# Altium schematic symbol library CUSTOM SCH - Copy.SchLib: 494 symbols (part 3 of 6)
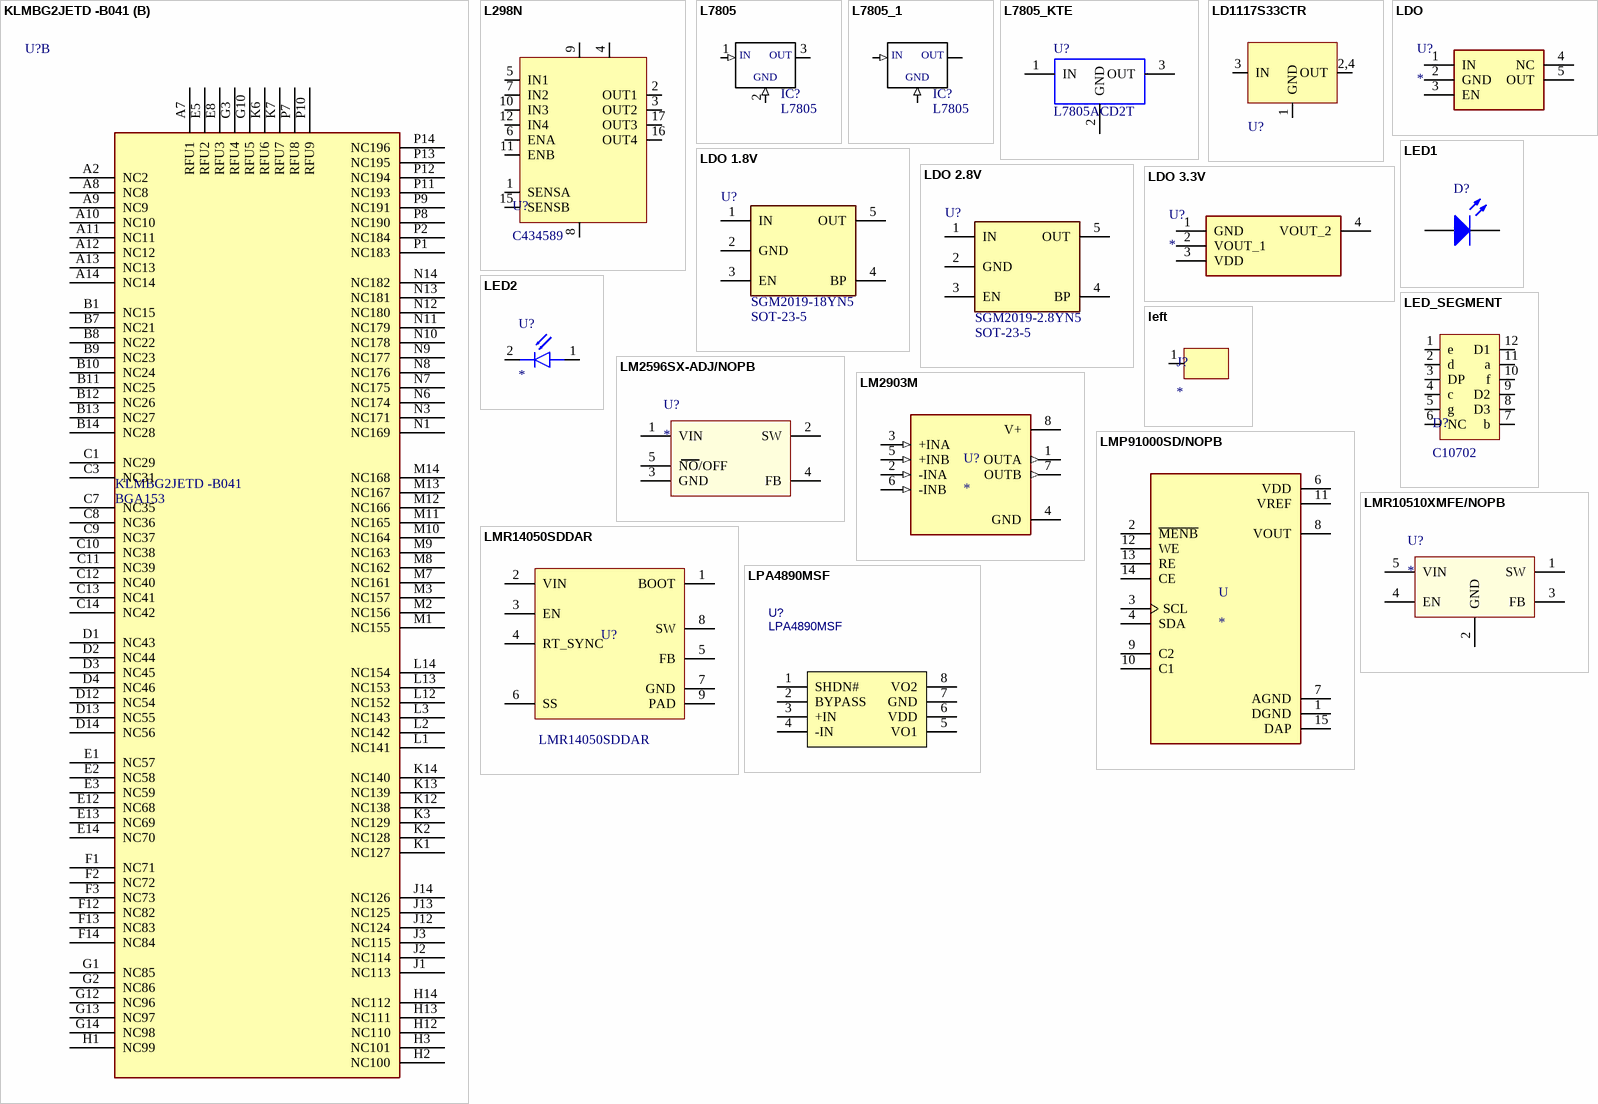
[diagram p51: symbols KLMBG2JETD -B041 to LPA4890MSF]

## LD1117S33CTR
designator U?
LDO Voltage Regulators 3.3V 0.8A Positive; Manufacturer 1: STMicroelectronics; Manufacturer Part Number 1: LD1117S33CTR; Accuracy: 1%; Input Bias Current: 5mA; Number of Regulators: 1; Quiescent Current: 10mA; Power Dissipation: 12W; Output Current: 950mA; Min Input Voltage: 5.3V; Dropout Voltage: 1.1V; Max Output Current: 1.3A; Max Input Voltage: 15V; Output Type: Fixed; Supplier 1: Digi-Key; RoHS: Yes; Category: Voltage Regulators - Linear; Stock 1: 40691; Pricing 1: 1=0.41000, 10=0.35100, 25=0.32720, 100=0.24310, 250=0.20572, 500=0.19636, 1000=0.14493 (USD); Mount: Surface Mount; Case/Package: SOT-223; Number of Pins: 4; Weight: 0.01lb; Contact Plating: Tin,Matte; Number of Terminals: 4; Min Operating Temperature: -40°C; Max Operating Temperature: 125°C; Output Voltage Accuracy: 1%; Polarity: Positive; Min Output Voltage: 3.3V; Max Output Voltage: 3.3V; Termination: SMD/SMT; Number of Outputs: 1; Output Voltage: 3.3V; Packaging: Tape and Reel; Nominal Output Voltage: 3.3V; Package Quantity: 1; Max Power Dissipation: 12W; Max Supply Voltage: 15V; Min Supply Voltage: 3.3V; Length: 6.5mm; Height: 1.8mm; Width: 3.5mm; Radiation Hardening: No; Lead Free: Lead Free; REACH SVHC: No SVHC; ComponentLink1URL: https://datasheet.ciiva.com/19480/1390223-19480586.pdf?src-supplier=Jameco; ComponentLink1Description: https://datasheet.ciiva.com/19480/1390223-19480586.pdf?src-supplier=Jameco; ComponentLink2URL: https://datasheet.ciiva.com/1511/1776449-1511572.pdf?src-supplier=Element14; ComponentLink2Description: https://datasheet.ciiva.com/1511/1776449-1511572.pdf?src-supplier=Element14; ComponentLink3URL: https://datasheet.ciiva.com/7992/1776449-7992620.pdf?src-supplier=Element14; ComponentLink3Description: https://datasheet.ciiva.com/7992/1776449-7992620.pdf?src-supplier=Element14; ComponentLink4URL: https://datasheet.ciiva.com/2041/cd00000544-2041934.pdf?src-supplier=Digi-Key; ComponentLink4Description: https://datasheet.ciiva.com/2041/cd00000544-2041934.pdf?src-supplier=Digi-Key; ComponentLink5URL: https://datasheet.ciiva.com/16392/cd00000544-16392069.pdf?src-supplier=Future+Electronics; ComponentLink5Description: https://datasheet.ciiva.com/16392/cd00000544-16392069.pdf?src-supplier=Future+Electronics; ComponentLink6URL: https://datasheet.ciiva.com/2041/cd00000544-2041932.pdf?src-supplier=Digi-Key; ComponentLink6Description: https://datasheet.ciiva.com/2041/cd00000544-2041932.pdf?src-supplier=Digi-Key; ComponentLink7URL: https://datasheet.ciiva.com/2041/cd00000544-2041933.pdf?src-supplier=Digi-Key; ComponentLink7Description: https://datasheet.ciiva.com/2041/cd00000544-2041933.pdf?src-supplier=Digi-Key; Supplier Part Number 1: 497-1241-1-ND
footprint AMS1117 (SOT223)
pins: 1 GND, 2 OUT, 3 IN, 4
text: 2,4

## LDO
designator U?
LDO Voltage Regulators; Manufacturer Part Number: *; Case/Package: SOT25; Value: *
footprint SOT25
pins: 1 IN, 2 GND, 3 EN, 4 NC, 5 OUT

## LDO 1.8V
designator U?  Manufacturer Part Number: SGM2019-18YN5  Case/Package: SOT-23-5
1.8V Output,300mA, Low Power,Low-Noise, Low Dropout,RF-Linear Regulators,CMOS linear. Vin from 2.5V to 5.5V.
footprint SOT_23_5
footprint Model Name (Footprint not found)
pins: 1 IN, 2 GND, 3 EN, 4 BP, 5 OUT

## LDO 2.8V
designator U?  Manufacturer Part Number: SGM2019-2.8YN5  Case/Package: SOT-23-5
2.8V Output,300mA, Low Power,Low-Noise, Low Dropout,RF-Linear Regulators,CMOS linear. Vin from 2.5V to 5.5V.
footprint SOT_23_5
pins: 1 IN, 2 GND, 3 EN, 4 BP, 5 OUT

## LDO 3.3V
designator U?
Fixed 6V 3.3V 390mV @ 1A SOT-223 Dropout Regulators(LDO) RoHS; Manufacturer Part Number: BL9110-330BPFB; Case/Package: SOT223
footprint SOT230P700X180-4N
footprint SOT223
pins: 1 GND, 2 VOUT_1, 3 VDD, 4 VOUT_2

## LED1
designator D?
Typical RED GaAs LED; Manufacturer Part Number: LED; Case/Package: 0603
simulation model LED1 (Diode)
footprint LED_0603 ((1608) Metric)
pins: A, K

## LED2
designator U?
pins: 1 A, 2 K

## LED_SEGMENT
designator D?, comment C10702
Red 3 0.36 Common Cathode Plugin Led; Manufacturer Part Number: FJ3361AH; Case/Package: Plugin; ComponentLink1Description: New link; ComponentLink1URL: https://www.lcsc.com/product-detail/Led-Segment-Display_Shenzhen-Zhihao-Elec-FJ3361AH_C10702.html
footprint RED_LED SEGMENT
pins: 1 e, 2 d, 3 DP, 4 c, 5 g, 6 NC, 7 b, 8 D3, 9 D2, 10 f, 11 a, 12 D1

## left
designator J?
footprint Left
pins: 1

## LM2596SX-ADJ/NOPB
designator U?
Buck Switching Regulator IC Positive Adjustable 1.2V 1 Output 3A TO-263-6, D²Pak (5 Leads + Tab), TO-263BA; Manufacturer: TI National Semiconductor; Manufacturer Part Number: LM2596SX-ADJ/NOPB; Number of Outputs: 1; Output Voltage: 37V; Min Input Voltage: 4.5V; Max Input Voltage: 40V; Switching Frequency: 173kHz; Efficiency: 73%; Synchronous Rectifier: No; Quiescent Current: 5mA; Supplier 1: Digi-Key; Stock 1: 1988; Pricing 1: 1=4.91, 10=4.413, 100=3.4299 (USD); Mount: Surface Mount; Case/Package: TO-263-5; Number of Pins: 5; Weight: 0.056128oz; Contact Plating: Tin,Matte; Min Operating Temperature: -40°C; Max Operating Temperature: 125°C; Package Quantity: 500; Max Output Current: 3A; Operating Supply Voltage: 40V; Output Current: 3A; Packaging: Tape and Reel; Min Supply Voltage: 4.5V; Min Output Voltage: 1.2V; Max Output Voltage: 37V; Output Type: Adjustable; Output Configuration: Positive; Length: 0.25inch; Height: 0.25inch; Width: 0.25inch; Radiation Hardening: No; Lead Free: Contains Lead; REACH SVHC: No SVHC; ComponentLink1URL: http://www.farnell.com/datasheets/1768026.pdf?src-supplier=Farnell; ComponentLink1Description: http://www.farnell.com/datasheets/1768026.pdf?src-supplier=Farnell; ComponentLink2URL: http://www.farnell.com/datasheets/1874590.pdf?src-supplier=Element14; ComponentLink2Description: http://www.farnell.com/datasheets/1874590.pdf?src-supplier=Element14; ComponentLink3URL: http://www.farnell.com/datasheets/1768026.pdf?src-supplier=Element14; ComponentLink3Description: http://www.farnell.com/datasheets/1768026.pdf?src-supplier=Element14; ComponentLink4URL: http://www.ti.com/lit/ds/symlink/lm2596.pdf?src-supplier=Digi-Key; ComponentLink4Description: http://www.ti.com/lit/ds/symlink/lm2596.pdf?src-supplier=Digi-Key; Supplier Part Number 1: 296-35399-1-ND
footprint TO-263
pins: 1 VIN, 2 SW, 3 GND, 4 FB, 5 NO/OFF

## LM2903M
designator U?
Low offset, dual differential comparator, automotive drade 8-SOIC -40 to 85; Manufacturer Part Number: LM2903M/NOPB; Case/Package: SOIC-8 Texas Instruments
footprint SOIC-8 - duplicate
pins: 1 OUTA (out), 2 -INA (in), 3 +INA (in), 4 GND (power), 5 +INB (in), 6 -INB (in), 7 OUTB (out), 8 V+ (power)

## LMP91000SD/NOPB
designator U
1 Channel AFE 8 Bit 14-WSON _4x4_; MF: Texas Instruments; MP: LMP91000SD/NOPB; Package: WFDFN-14 Texas Instruments; Price: None; SnapEDA_Link: https://www.snapeda.com/parts/LMP91000SD/NOPB/Texas%20Instruments/view-part/547082/?ref=snap; Availability: Unavailable; Value: *
footprint SON50P400X400X80-15N
pins: 1 DGND (power), 2 ~{MENB}, 3 SCL, 4 SDA, 6 VDD (power), 7 AGND (power), 8 VOUT, 9 C2, 10 C1, 11 VREF (power), 12 WE, 13 RE, 14 CE, 15 DAP (power)

## LMR10510XMFE/NOPB
designator U?
3V-5.5Vin, 600mV-4.5Vout, 1Aout, SOT-23-5; Manufacturer: Texas Instruments; Manufacturer Part Number: LMR10510XMFE/NOPB; Max Input Voltage: 5.5V; Output Voltage: 4.5V; Min Input Voltage: 3V; Number of Outputs: 1; Switching Frequency: 1.6MHz; Max Output Current: 1A; Min Output Voltage: 600mV; Quiescent Current: 3.3mA; Output Type: Adjustable; Supplier 1: Mouser; Stock 1: 1253; Pricing 1: 1=1.33, 10=1.13, 100=0.871, 500=0.77, 1000=0.608, 2500=0.539, 10000=0.519, 25000=0.503, 50000=0.487 (USD); Mount: Surface Mount; Case/Package: SOT-23; Number of Pins: 5; Min Operating Temperature: -40°C; Max Operating Temperature: 125°C; Packaging: Tape and Reel; Max Output Voltage: 4.5V; Output Current: 1A; Package Quantity: 250; Length: 3.05mm; Height: 1.3mm; Width: 1.75mm; REACH SVHC: No SVHC; Lead Free: Lead Free; ComponentLink1URL: http://www.farnell.com/datasheets/1882450.pdf?src-supplier=Element14; ComponentLink1Description: http://www.farnell.com/datasheets/1882450.pdf?src-supplier=Element14; Supplier Part Number 1: 926-LMR10510XMFENOPB
pins: 1 SW, 2 GND, 3 FB, 4 EN, 5 VIN

## LMR14050SDDAR
designator U?
Manufacturer Name: Texas Instruments; Manufacturer Part Number: LMR14050SDDAR; Value: N/A; PackageReference: LMR14050SDDAR
footprint SOIC-8_EP_150mil
pins: 1 BOOT, 2 VIN (power), 3 EN, 4 RT_SYNC, 5 FB, 6 SS, 7 GND (power), 8 SW (power), 9 PAD (power)

## LPA4890MSF
designator U?
Manufacturer Part Number: LPA4890MSF; Case/Package: MSOP-8
footprint MSOP-8_L3.0-W3.0-P0.65-LS5.0-BL
footprint MSOP-8
pins: 1 SHDN#, 2 BYPASS, 3 +IN, 4 -IN, 5 VO1, 6 VDD, 7 GND, 8 VO2

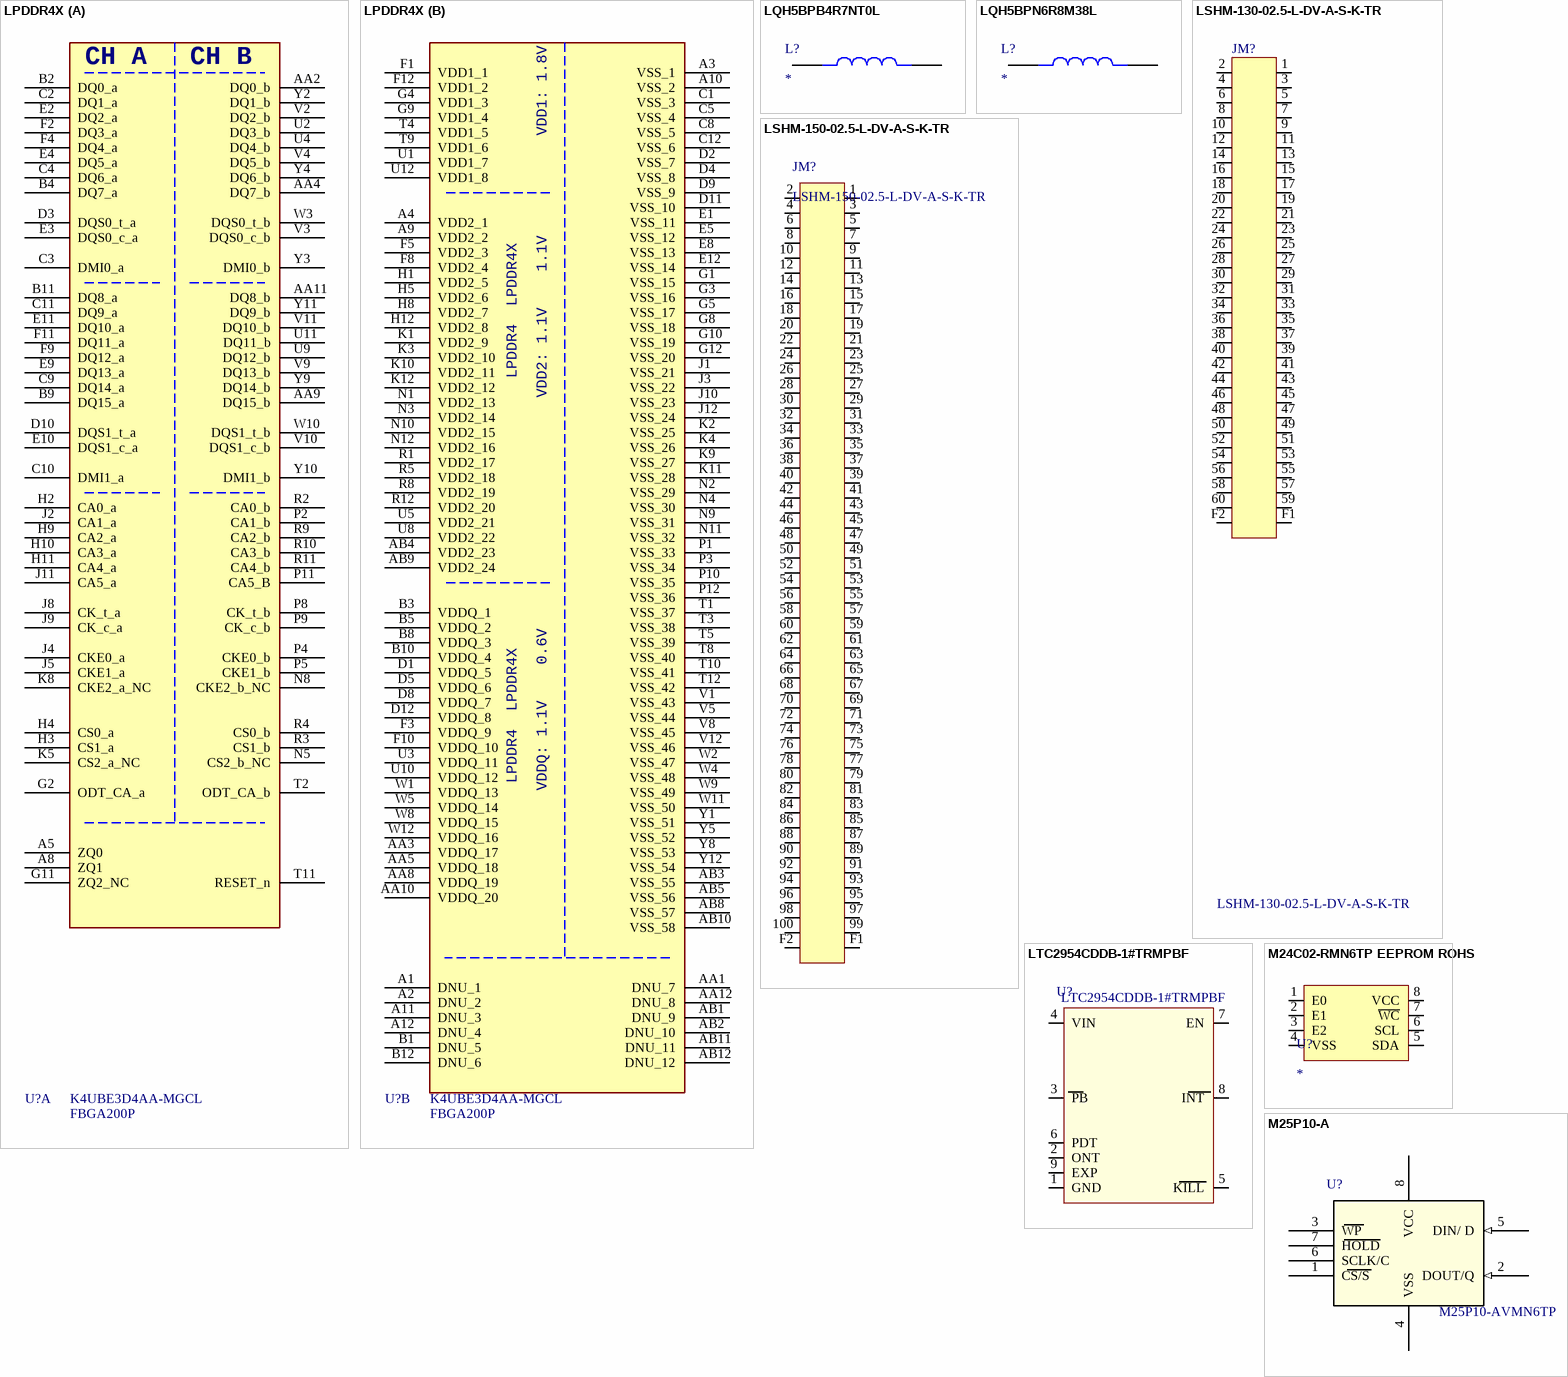
[diagram p16: symbols LPDDR4X to M25P10-A]

## LPDDR4X
designator U?  Manufacturer Part Number: K4UBE3D4AA-MGCL  Case/Package: FBGA200P
LPDDR4_200P
footprint FBGA200_15R00X10R00X0R90
part A pins: A5 ZQ0, A8 ZQ1, AA2 DQ0_b, AA4 DQ7_b, AA9 DQ15_b, AA11 DQ8_b, B2 DQ0_a, B4 DQ7_a, B9 DQ15_a, B11 DQ8_a, C2 DQ1_a, C3 DMI0_a, C4 DQ6_a, C9 DQ14_a, C10 DMI1_a, C11 DQ9_a, D3 DQS0_t_a, D10 DQS1_t_a, E2 DQ2_a, E3 DQS0_c_a, E4 DQ5_a, E9 DQ13_a, E10 DQS1_c_a, E11 DQ10_a, F2 DQ3_a, F4 DQ4_a, F9 DQ12_a, F11 DQ11_a, G2 ODT_CA_a, G11 ZQ2_NC, H2 CA0_a, H3 CS1_a, H4 CS0_a, H9 CA2_a, H10 CA3_a, H11 CA4_a, J2 CA1_a, J4 CKE0_a, J5 CKE1_a, J8 CK_t_a, J9 CK_c_a, J11 CA5_a, K5 CS2_a_NC, K8 CKE2_a_NC, N5 CS2_b_NC, N8 CKE2_b_NC, P2 CA1_b, P4 CKE0_b, P5 CKE1_b, P8 CK_t_b, P9 CK_c_b, P11 CA5_B, R2 CA0_b, R3 CS1_b, R4 CS0_b, R9 CA2_b, R10 CA3_b, R11 CA4_b, T2 ODT_CA_b, T11 RESET_n, U2 DQ3_b, U4 DQ4_b, U9 DQ12_b, U11 DQ11_b, V2 DQ2_b, V3 DQS0_c_b, V4 DQ5_b, V9 DQ13_b, V10 DQS1_c_b, V11 DQ10_b, W3 DQS0_t_b, W10 DQS1_t_b, Y2 DQ1_b, Y3 DMI0_b, Y4 DQ6_b, Y9 DQ14_b, Y10 DMI1_b, Y11 DQ9_b
part B pins: A1 DNU_1, A2 DNU_2, A3 VSS_1 (power), A4 VDD2_1 (power), A9 VDD2_2 (power), A10 VSS_2 (power), A11 DNU_3, A12 DNU_4, AA1 DNU_7, AA3 VDDQ_17 (power), AA5 VDDQ_18 (power), AA8 VDDQ_19 (power), AA10 VDDQ_20 (power), AA12 DNU_8, AB1 DNU_9, AB2 DNU_10, AB3 VSS_55 (power), AB4 VDD2_23 (power), AB5 VSS_56 (power), AB8 VSS_57 (power), AB9 VDD2_24 (power), AB10 VSS_58 (power), AB11 DNU_11, AB12 DNU_12, B1 DNU_5, B3 VDDQ_1 (power), B5 VDDQ_2 (power), B8 VDDQ_3 (power), B10 VDDQ_4 (power), B12 DNU_6, C1 VSS_3 (power), C5 VSS_4 (power), C8 VSS_5 (power), C12 VSS_6 (power), D1 VDDQ_5 (power), D2 VSS_7 (power), D4 VSS_8 (power), D5 VDDQ_6 (power), D8 VDDQ_7 (power), D9 VSS_9 (power), D11 VSS_10 (power), D12 VDDQ_8 (power), E1 VSS_11 (power), E5 VSS_12 (power), E8 VSS_13 (power), E12 VSS_14 (power), F1 VDD1_1 (power), F3 VDDQ_9 (power), F5 VDD2_3 (power), F8 VDD2_4 (power), F10 VDDQ_10 (power), F12 VDD1_2 (power), G1 VSS_15 (power), G3 VSS_16 (power), G4 VDD1_3 (power), G5 VSS_17 (power), G8 VSS_18 (power), G9 VDD1_4 (power), G10 VSS_19 (power), G12 VSS_20 (power), H1 VDD2_5 (power), H5 VDD2_6 (power), H8 VDD2_7 (power), H12 VDD2_8 (power), J1 VSS_21 (power), J3 VSS_22 (power), J10 VSS_23 (power), J12 VSS_24 (power), K1 VDD2_9 (power), K2 VSS_25 (power), K3 VDD2_10 (power), K4 VSS_26 (power), K9 VSS_27 (power), K10 VDD2_11 (power), K11 VSS_28 (power), K12 VDD2_12 (power), N1 VDD2_13 (power), N2 VSS_29 (power), N3 VDD2_14 (power), N4 VSS_30 (power), N9 VSS_31 (power), N10 VDD2_15 (power), N11 VSS_32 (power), N12 VDD2_16 (power), P1 VSS_33 (power), P3 VSS_34 (power), P10 VSS_35 (power), P12 VSS_36 (power), R1 VDD2_17 (power), R5 VDD2_18 (power), R8 VDD2_19 (power), R12 VDD2_20 (power), T1 VSS_37 (power), T3 VSS_38 (power), T4 VDD1_5 (power), T5 VSS_39 (power), T8 VSS_40 (power), T9 VDD1_6 (power), T10 VSS_41 (power), T12 VSS_42 (power), U1 VDD1_7 (power), U3 VDDQ_11 (power), U5 VDD2_21 (power), U8 VDD2_22 (power), U10 VDDQ_12 (power), U12 VDD1_8 (power), V1 VSS_43 (power), V5 VSS_44 (power), V8 VSS_45 (power), V12 VSS_46 (power), W1 VDDQ_13 (power), W2 VSS_47 (power), W4 VSS_48 (power), W5 VDDQ_14 (power), W8 VDDQ_15 (power), W9 VSS_49 (power), W11 VSS_50 (power), W12 VDDQ_16 (power), Y1 VSS_51 (power), Y5 VSS_52 (power), Y8 VSS_53 (power), Y12 VSS_54 (power)
part A text: CH A; CH B
part B text: VDD1: 1.8V; LPDDR4  LPDDR4X; VDD2: 1.1V    1.1V; VDDQ: 1.1V    0.6V

## LQH5BPB4R7NT0L
designator L?
4.7uH ±30% 58mΩ 2020 Inductors (SMD); Manufacturer Part Number: LQH5BPB4R7NT0L; Case/Package: 2020; Value: 4.7uH
footprint 2020_4.7uH
pins: 1, 2

## LQH5BPN6R8M38L
designator L?
6.8uH ±20% 39mΩ 2020 Inductors (SMD); Manufacturer Part Number: LQH5BPN6R8M38L; Case/Package: 2020; Value: 6.8uH
footprint 2020_6.8uH
pins: 1, 2

## LSHM-130-02.5-L-DV-A-S-K-TR
designator JM?, comment Manufacturer Part Number: LSHM-130-02.5-L-DV-A-S-K-TR  (hidden comment: LSHM-130-02.5-L-DV-A-S-K-T)
Stacking Board Connector, Razor Beam LSHM Series, 60 Contacts, 0.5 mm; Manufacturer: Samtec; Number of Contacts: 60; Pitch: 0.5mm; ComponentLink1URL: https://datasheet.ciiva.com/9572/lshm-9572310.pdf?src-supplier=Avnet; ComponentLink1Description: https://datasheet.ciiva.com/9572/lshm-9572310.pdf?src-supplier=Avnet; Supplier 1: Digi-Key; RoHS: Yes; Category: Headers and Wire Housings; Stock 1: 1173; Pricing 1: 1=8.09000, 10=7.75100, 25=7.07720, 50=6.74000, 100=6.40300, 250=5.72900 (USD); Contact Plating: Gold; Contact Material: Bronze; Housing Color: Black; Housing Material: Polymer; Min Operating Temperature: -55°C; Max Operating Temperature: 125°C; Number of Rows: 2; Termination: Solder; Packaging: Tape and Reel; Orientation: Straight; Length: 34.7mm; Depth: 4.98mm; Radiation Hardening: No; RoHS Compliant: Yes; ComponentLink2URL: https://datasheet.ciiva.com/9688/lshm-9688495.pdf?src-supplier=Avnet; ComponentLink2Description: https://datasheet.ciiva.com/9688/lshm-9688495.pdf?src-supplier=Avnet; Supplier Part Number 1: SAM14106CT-ND
pins: 1, 2, 3, 4, 5, 6, 7, 8, 9, 10, 11, 12, 13, 14, 15, 16, 17, 18, 19, 20, 21, 22, 23, 24, 25, 26, 27, 28, 29, 30, 31, 32, 33, 34, 35, 36, 37, 38, 39, 40, 41, 42, 43, 44, 45, 46, 47, 48, 49, 50, 51, 52, 53, 54, 55, 56, 57, 58, 59, 60, F1 101, F2 102

## LSHM-150-02.5-L-DV-A-S-K-TR
designator JM?
Stacking Board Connector, Razor Beam LSHM Series, 100 Contacts, 0.5 mm; Manufacturer: Samtec; Number of Contacts: 100; Pitch: 0.5mm; Supplier 1: Digi-Key; Manufacturer Part Number: LSHM-150-02.5-L-DV-A-S-K-TR; RoHS: Yes; Category: Headers and Wire Housings; Stock 1: 1387; Pricing 1: 1=10.28000, 10=9.83400, 25=8.94000, 50=8.49300, 100=8.26950, 250=7.37552 (USD); Contact Plating: Gold; Contact Material: Bronze; Housing Color: Black; Housing Material: Polymer; Min Operating Temperature: -55°C; Max Operating Temperature: 125°C; Packaging: Tape and Reel; Number of Rows: 2; Termination: Solder; Orientation: Straight; Length: 54.7mm; Depth: 4.98mm; Radiation Hardening: No; RoHS Compliant: Yes; ComponentLink1URL: https://datasheet.ciiva.com/9572/lshm-9572310.pdf?src-supplier=Avnet; ComponentLink1Description: https://datasheet.ciiva.com/9572/lshm-9572310.pdf?src-supplier=Avnet; Supplier Part Number 1: SAM14147CT-ND
pins: 1, 2, 3, 4, 5, 6, 7, 8, 9, 10, 11, 12, 13, 14, 15, 16, 17, 18, 19, 20, 21, 22, 23, 24, 25, 26, 27, 28, 29, 30, 31, 32, 33, 34, 35, 36, 37, 38, 39, 40, 41, 42, 43, 44, 45, 46, 47, 48, 49, 50, 51, 52, 53, 54, 55, 56, 57, 58, 59, 60, 61, 62, 63, 64, 65, 66, 67, 68, 69, 70, 71, 72, 73, 74, 75, 76, 77, 78, 79, 80, 81, 82, 83, 84, 85, 86, 87, 88, 89, 90, 91, 92, 93, 94, 95, 96, 97, 98, 99, 100, F1 101, F2 102

## LTC2954CDDB-1#TRMPBF
designator U?  Manufacturer Part Number: LTC2954CDDB-1#TRMPBF
IC PUSH BUTTON ON/OFF CTRLR DFN-8; Manufacturer 1: Analog Devices / Linear Technology; Operating Supply Current: 6uA; Supplier 1: Digi-Key; RoHS: Yes; Category: Voltage Supervisors; Stock 1: 3877; Pricing 1: 1=4.56000, 25=2.59000, 100=2.52300 (USD); Case/Package: DFN-8; Number of Pins: 8; Min Operating Temperature: 0°C; Max Operating Temperature: 70°C; Package Quantity: 500; Packaging: Tape and Reel; Radiation Hardening: No; Lead Free: Lead Free; ComponentLink1URL: https://datasheet.ciiva.com/15134/getdatasheetpartid-369007-15134872.pdf?src-supplier=Verical; ComponentLink1Description: https://datasheet.ciiva.com/15134/getdatasheetpartid-369007-15134872.pdf?src-supplier=Verical; ComponentLink2URL: https://datasheet.ciiva.com/1967/16598-1967282.pdf?src-supplier=Digi-Key; ComponentLink2Description: https://datasheet.ciiva.com/1967/16598-1967282.pdf?src-supplier=Digi-Key; ComponentLink3URL: https://datasheet.ciiva.com/1967/16598-1967283.pdf?src-supplier=Digi-Key; ComponentLink3Description: https://datasheet.ciiva.com/1967/16598-1967283.pdf?src-supplier=Digi-Key; ComponentLink4URL: https://datasheet.ciiva.com/1967/16598-1967284.pdf?src-supplier=Digi-Key; ComponentLink4Description: https://datasheet.ciiva.com/1967/16598-1967284.pdf?src-supplier=Digi-Key; ComponentLink5URL: https://datasheet.ciiva.com/48696/001256188-da-01-en-ic-push-b-ltc2954cddb-1-trmpbf-dfn-8-ltc-48696487.pdf?src-supplier=Conrad; ComponentLink5Description: https://datasheet.ciiva.com/48696/001256188-da-01-en-ic-push-b-ltc2954cddb-1-trmpbf-dfn-8-ltc-48696487.pdf?src-supplier=Conrad; Supplier Part Number 1: LTC2954CDDB-1#TRMPBFCT-ND
pins: 1 GND, 2 ONT, 3 PB, 4 VIN, 5 KILL, 6 PDT, 7 EN, 8 INT, 9 EXP

## M24C02-RMN6TP EEPROM ROHS
designator U?
EEPROM Memory IC 2Kbit I²C 400 kHz 900 ns 8-SOIC; Parameter 1: *; Parameter 2: *
footprint soic-8 - duplicate
pins: 1 E0, 2 E1, 3 E2, 4 VSS, 5 SDA, 6 SCL, 7 ~{WC}, 8 VCC

## M25P10-A
designator U?  Manufacturer Part Number: M25P10-AVMN6TP
IC FLASH 1M SPI 50MHZ 8-SOIC; Manufacturer: Micron Technology; Memory Type: FLASH,NOR; Access Time: 8ns; Interface: SPI,Serial; Address Bus Width: 1b; Max Supply Voltage: 3.6V; Min Supply Voltage: 2.7V; Word Size: 8b; Number of Words: 128000; Nominal Supply Current: 8mA; Operating Supply Voltage: 3.3V; Density: 1Mb; Sync/Async: Synchronous; Voltage: 2.3V; Supplier 1: Digi-Key; Stock 1: 0; Number of Pins: 8; Min Operating Temperature: -40°C; Max Operating Temperature: 85°C; Packaging: Tape and Reel; Package Quantity: 1; Frequency: 50MHz; Radiation Hardening: No; ComponentLink1URL: https://media.digikey.com/pdf/Data%20Sheets/Micron%20Technology%20Inc%20PDFs/M25P10-A.pdf?src-supplier=Digi-Key; ComponentLink1Description: https://media.digikey.com/pdf/Data%20Sheets/Micron%20Technology%20Inc%20PDFs/M25P10-A.pdf?src-supplier=Digi-Key; ComponentLink2URL: http://media.digikey.com/pdf/Data%20Sheets/Micron%20Technology%20Inc%20PDFs/M25P10-A.pdf?src-supplier=Digi-Key; ComponentLink2Description: http://media.digikey.com/pdf/Data%20Sheets/Micron%20Technology%20Inc%20PDFs/M25P10-A.pdf?src-supplier=Digi-Key; ComponentLink3URL: https://www.verical.com/server-webapp/html/getDatasheet?partID=308150&src-supplier=Verical; ComponentLink3Description: https://www.verical.com/server-webapp/html/getDatasheet?partID=308150&src-supplier=Verical; Case/Package: 8-SOIC; Supplier Part Number 1: M25P10-AVMN6TPDKR-ND
footprint 8-soic
pins: 1 CS/S, 2 DOUT/Q (in), 3 WP, 4 VSS, 5 DIN/ D (in), 6 SCLK/C, 7 HOLD, 8 VCC

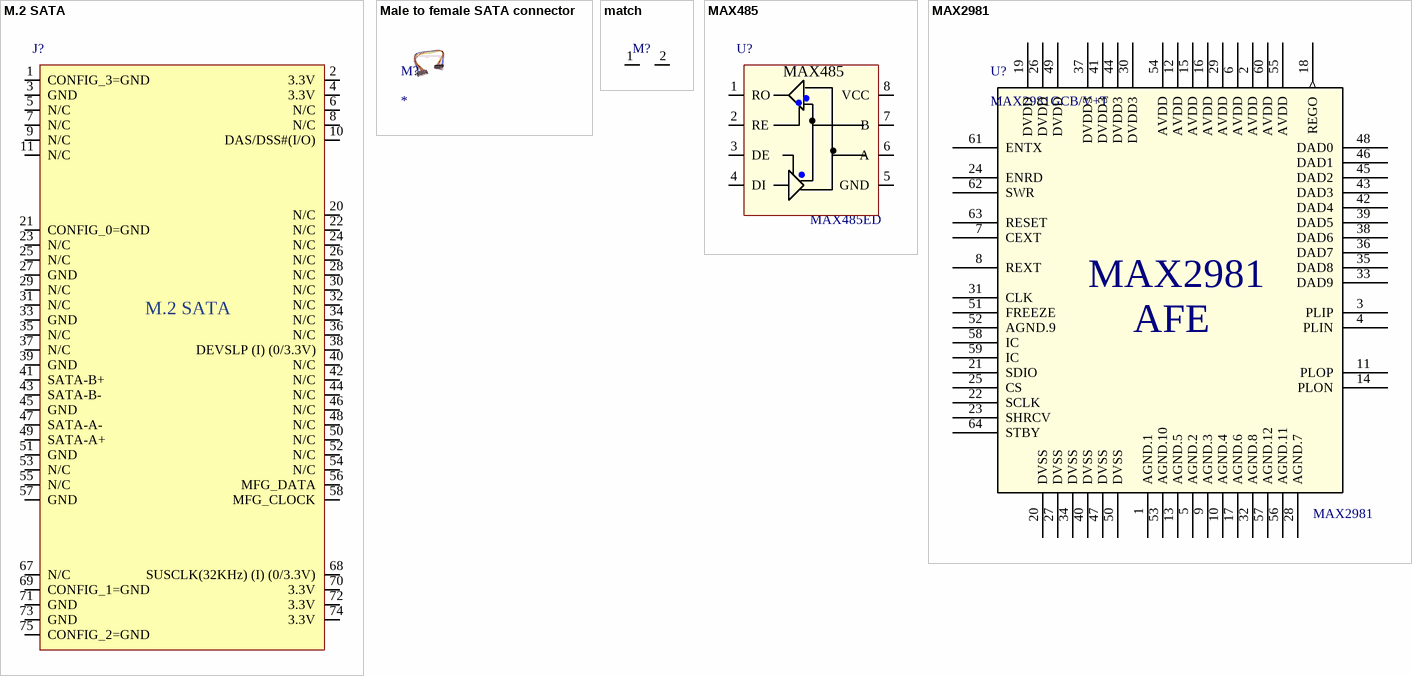
[diagram p17: symbols M.2 SATA to MAX2981]

## M.2 SATA
designator J?, comment 2199230-3  (value not drawn)
67 Position Female Connector M.2 (NGFF) (0.50mm) Black; Manufacturer: TE Connectivity; Manufacturer Part Number: 1-2199230-6; Number of Positions: 67; PCB Mounting Orientation: Right Angle; Contact Current Rating: 500mA; Pitch: 0.5mm; ComponentLink1URL: https://datasheet.ciiva.com/29349/eng-cd-2199230-b1-c-2199230-b1-29349141.pdf?src-supplier=Digi-Key; ComponentLink1Description: https://datasheet.ciiva.com/29349/eng-cd-2199230-b1-c-2199230-b1-29349141.pdf?src-supplier=Digi-Key; Supplier 1: Digi-Key; RoHS: Yes; Category: Headers and Wire Housings; Stock 1: 18950; Pricing 1: 1=1.46000, 10=1.32100, 25=1.24040, 50=1.18660, 100=1.13260, 250=1.02472, 500=0.94382 (USD); Mount: Surface Mount; Housing Color: Black; Contact Material: Copper Alloy; Contact Plating: Gold,Matte; Housing Material: Thermoplastic; Color: Black; Insulation Material: Thermoplastic; Min Operating Temperature: -40°C; Max Operating Temperature: 80°C; Orientation: Right Angle; Packaging: Tape and Reel; Number of Rows: 2; Termination: Solder; Gender: Female; Length: 0.862inch; Width: 8.7mm; Height: 0.165inch; ELV: Compliant; RoHS Compliant: Yes; Supplier Part Number 1: A118046CT-ND
footprint TE_2199230-3
pins: 1 CONFIG_3=GND, 2 3.3V, 3 GND, 4 3.3V, 5 N/C, 6 N/C, 7 N/C, 8 N/C, 9 N/C, 10 DAS/DSS#(I/O), 11 N/C, 20 N/C, 21 CONFIG_0=GND, 22 N/C, 23 N/C, 24 N/C, 25 N/C, 26 N/C, 27 GND, 28 N/C, 29 N/C, 30 N/C, 31 N/C, 32 N/C, 33 GND, 34 N/C, 35 N/C, 36 N/C, 37 N/C, 38 DEVSLP (I) (0/3.3V), 39 GND, 40 N/C, 41 SATA-B+, 42 N/C, 43 SATA-B-, 44 N/C, 45 GND, 46 N/C, 47 SATA-A-, 48 N/C, 49 SATA-A+, 50 N/C, 51 GND, 52 N/C, 53 N/C, 54 N/C, 55 N/C, 56 MFG_DATA, 57 GND, 58 MFG_CLOCK, 67 N/C, 68 SUSCLK(32KHz) (I) (0/3.3V), 69 CONFIG_1=GND, 70 3.3V, 71 GND, 72 3.3V, 73 GND, 74 3.3V, 75 CONFIG_2=GND

## Male to female SATA connector
designator M?  (mechanical)
Manufacturer Part Number: 22 pin SATA connector

## match
designator M?
footprint match
pins: 1, 2

## MAX485
designator U?  Manufacturer Part Number: MAX485ED  (hidden comment: *)
RS-485/RS-422 ICs; Case/Package: SOP-8; Value: *
pins: 1 RO, 2 RE, 3 DE, 4 DI, 5 GND, 6 A, 7 B, 8 VCC
text: .

## MAX2981
designator U?, comment MAX2981GCB/V+T  Manufacturer Part Number: MAX2981
Analog Front End - AFE AFE Txr for Powerline Comm; Manufacturer: Maxim; Max Supply Voltage: 3.6V; Min Supply Voltage: 3V; Interface: Serial; Logic Function: Transceiver; Number of Circuits: 1; Nominal Supply Current: 220mA; Max Power Dissipation: 2W; Number of Channels: 2; Max Frequency: 50MHz; Supplier 1: Digi-Key; Stock 1: 0; Case/Package: LQFP; Number of Pins: 64; Min Operating Temperature: -40°C; Max Operating Temperature: 105°C; Packaging: Tape and Reel; Package Quantity: 750; Radiation Hardening: No; ComponentLink1URL: http://www.maximintegrated.com/en/products/comms/powerline-networking/MAX2981.html?src-supplier=Mouser; ComponentLink1Description: http://www.maximintegrated.com/en/products/comms/powerline-networking/MAX2981.html?src-supplier=Mouser
footprint MAX2981_21-0083E-M
pins: 1 AGND.1 (power), 2 AVDD (power), 3 PLIP, 4 PLIN, 5 AGND.2 (power), 6 AVDD (power), 7 CEXT, 8 REXT, 9 AGND.3 (power), 10 AGND.4 (power), 11 PLOP, 12 AVDD (power), 13 AGND.5 (power), 14 PLON, 15 AVDD (power), 16 AVDD (power), 17 AGND.6 (power), 18 REGO (out), 19 DVDD (power), 20 DVSS (power), 21 SDIO, 22 SCLK, 23 SHRCV, 24 ENRD, 25 CS, 26 DVDD (power), 27 DVSS (power), 28 AGND.7 (power), 29 AVDD (power), 30 DVDD3 (power), 31 CLK, 32 AGND.8 (power), 33 DAD9, 34 DVSS (power), 35 DAD8, 36 DAD7, 37 DVDD3 (power), 38 DAD6, 39 DAD5, 40 DVSS (power), 41 DVDD3 (power), 42 DAD4, 43 DAD3, 44 DVDD3 (power), 45 DAD2, 46 DAD1, 47 DVSS (power), 48 DAD0, 49 DVDD (power), 50 DVSS (power), 51 FREEZE, 52 AGND.9 (power), 53 AGND.10 (power), 54 AVDD (power), 55 AVDD (power), 56 AGND.11 (power), 57 AGND.12 (power), 58 IC, 59 IC, 60 AVDD (power), 61 ENTX, 62 SWR, 63 RESET, 64 STBY
text: AFE

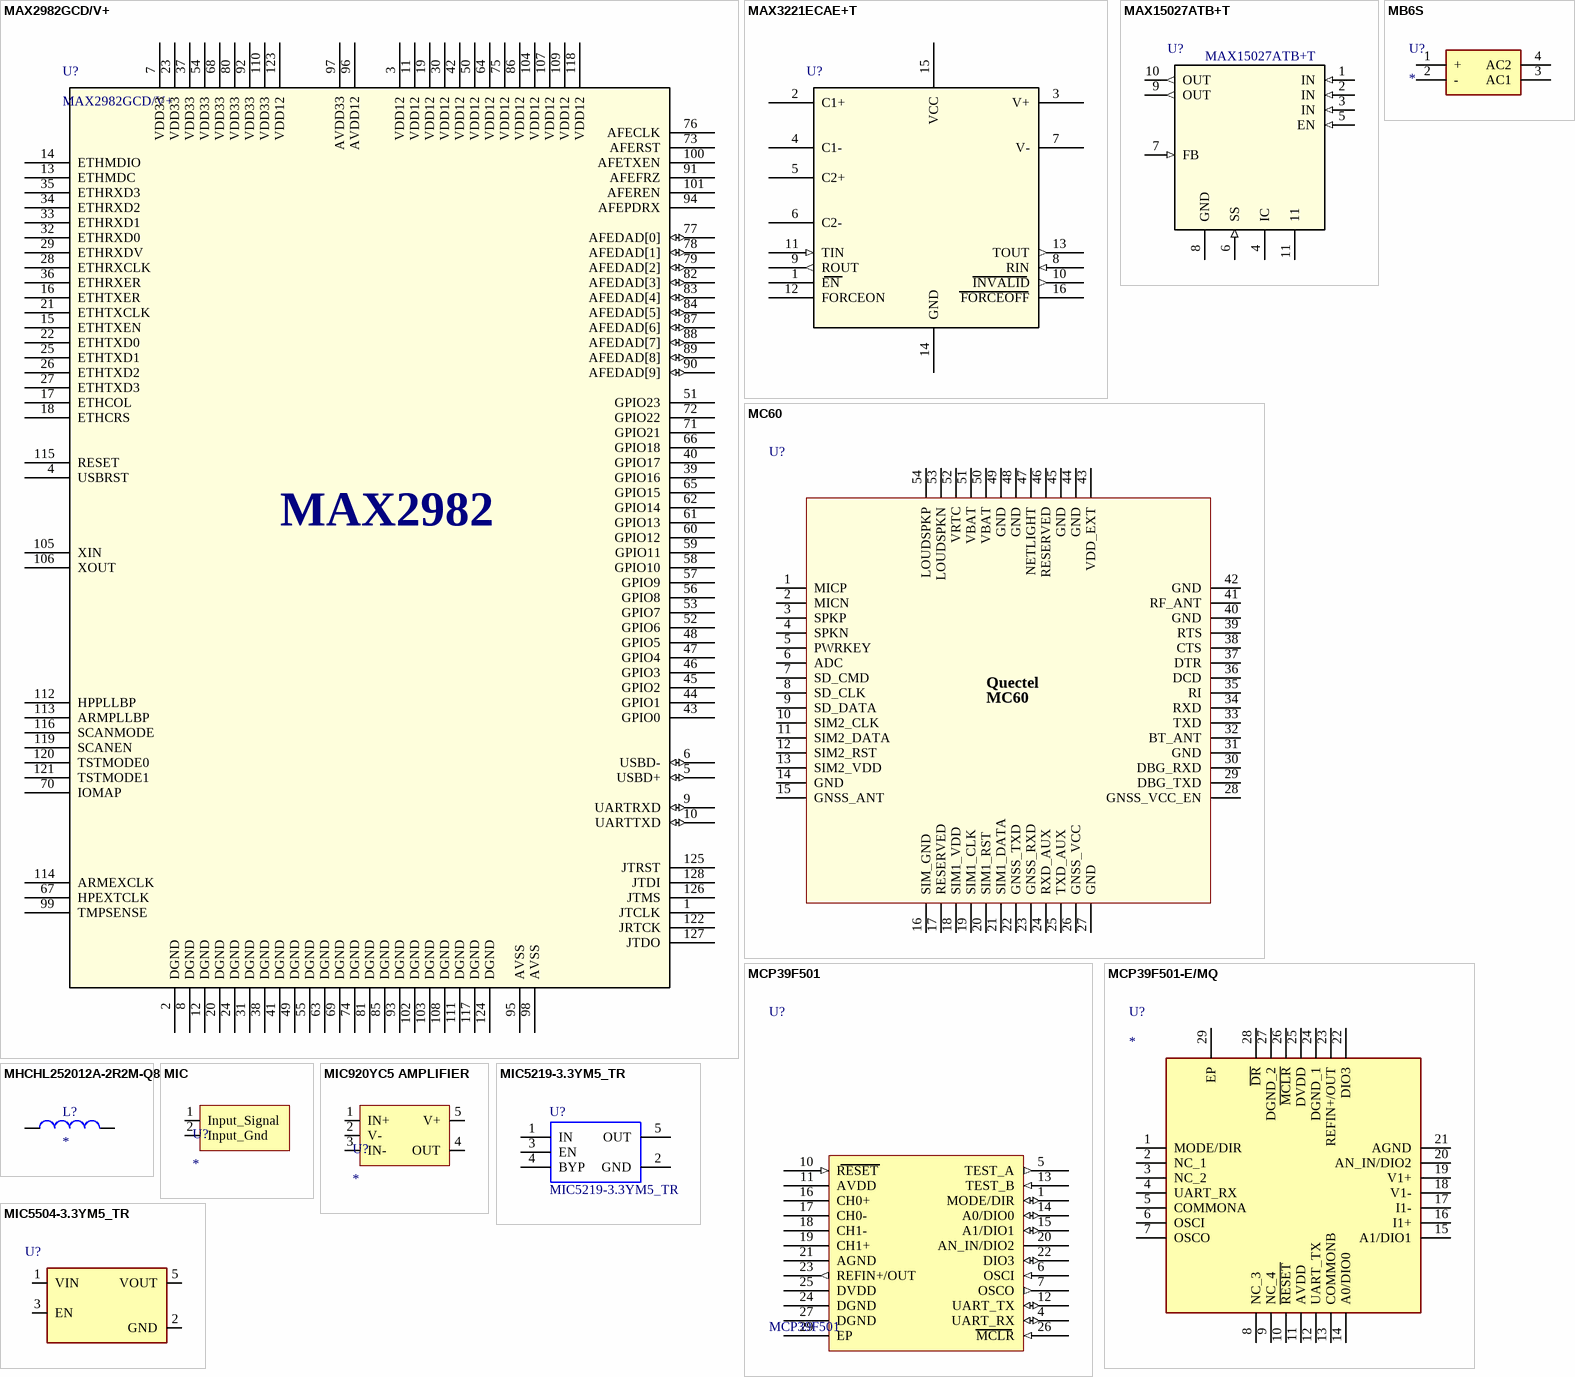
[diagram p18: symbols MAX2982GCD/V+ to MIC5504-3.3YM5_TR]

## MAX2982GCD/V+
designator U?
IC TXRX IBP MODEM 128-LQFP; Manufacturer: Maxim; Data Rate: 14Mbps; Supplier 1: Digi-Key; Manufacturer Part Number: MAX2982GCD/V+; Stock 1: 0; Case/Package: LQFP; Packaging: Rail/Tube; Package Quantity: 72; ComponentLink1URL: http://media.digikey.com/pdf/Data%20Sheets/Maxim%20PDFs/MAX2982.pdf?src-supplier=Digi-Key; ComponentLink1Description: http://media.digikey.com/pdf/Data%20Sheets/Maxim%20PDFs/MAX2982.pdf?src-supplier=Digi-Key; Supplier Part Number 1: MAX2982GCD/V+-ND
footprint MAX2982
pins: 1 JTCLK, 2 DGND (power), 3 VDD12 (power), 4 USBRST, 5 USBD+ (io), 6 USBD- (io), 7 VDD33 (power), 8 DGND (power), 9 UARTRXD (io), 10 UARTTXD (io), 11 VDD12 (power), 12 DGND (power), 13 ETHMDC, 14 ETHMDIO, 15 ETHTXEN, 16 ETHTXER, 17 ETHCOL, 18 ETHCRS, 19 VDD12 (power), 20 DGND (power), 21 ETHTXCLK, 22 ETHTXD0, 23 VDD33 (power), 24 DGND (power), 25 ETHTXD1, 26 ETHTXD2, 27 ETHTXD3, 28 ETHRXCLK, 29 ETHRXDV, 30 VDD12 (power), 31 DGND (power), 32 ETHRXD0, 33 ETHRXD1, 34 ETHRXD2, 35 ETHRXD3, 36 ETHRXER, 37 VDD33 (power), 38 DGND (power), 39 GPIO16, 40 GPIO17, 41 DGND (power), 42 VDD12 (power), 43 GPIO0, 44 GPIO1, 45 GPIO2, 46 GPIO3, 47 GPIO4, 48 GPIO5, 49 DGND (power), 50 VDD12 (power), 51 GPIO23, 52 GPIO6, 53 GPIO7, 54 VDD33 (power), 55 DGND (power), 56 GPIO8, 57 GPIO9, 58 GPIO10, 59 GPIO11, 60 GPIO12, 61 GPIO13, 62 GPIO14, 63 DGND (power), 64 VDD12 (power), 65 GPIO15, 66 GPIO18, 67 HPEXTCLK, 68 VDD33 (power), 69 DGND (power), 70 IOMAP, 71 GPIO21, 72 GPIO22, 73 AFERST, 74 DGND (power), 75 VDD12 (power), 76 AFECLK, 77 AFEDAD[0] (io), 78 AFEDAD[1] (io), 79 AFEDAD[2] (io), 80 VDD33 (power), 81 DGND (power), 82 AFEDAD[3] (io), 83 AFEDAD[4] (io), 84 AFEDAD[5] (io), 85 DGND (power), 86 VDD12 (power), 87 AFEDAD[6] (io), 88 AFEDAD[7] (io), 89 AFEDAD[8] (io), 90 AFEDAD[9] (io), 91 AFEFRZ, 92 VDD33 (power), 93 DGND (power), 94 AFEPDRX, 95 AVSS (power), 96 AVDD12 (power), 97 AVDD33 (power), 98 AVSS (power), 99 TMPSENSE, 100 AFETXEN, 101 AFEREN, 102 DGND (power), 103 DGND (power), 104 VDD12 (power), 105 XIN, 106 XOUT, 107 VDD12 (power), 108 DGND (power), 109 VDD12 (power), 110 VDD33 (power), 111 DGND (power), 112 HPPLLBP, 113 ARMPLLBP, 114 ARMEXCLK, 115 RESET, 116 SCANMODE, 117 DGND (power), 118 VDD12 (power), 119 SCANEN, 120 TSTMODE0, 121 TSTMODE1, 122 JRTCK, 123 VDD12 (power), 124 DGND (power), 125 JTRST, 126 JTMS, 127 JTDO, 128 JTDI
text: MAX2982

## MAX3221ECAE+T
designator U?
IC TXRX RS-232 W/SHTDWN 16SSOP; Manufacturer: Maxim; Manufacturer Part Number: MAX3221ECAE+T; Data Rate: 250Kbps; Nominal Supply Current: 1mA; Number of I/Os: 4; Propagation Delay: 0.3us; Number of Receivers: 1; Logic Function: Transceiver,Receiver; Min Supply Voltage: 3V; Max Supply Voltage: 5.5V; Simplex/Duplex: Full Duplex; Receiver Hysteresis: 500mV; Supplier 1: Digi-Key; Stock 1: 3995; Pricing 1: 1=4.61, 10=4.12, 25=3.708, 100=3.3784, 250=3.0488, 500=2.7357, 1000=2.3072 (USD); Mount: Surface Mount; Case/Package: 16-SSOP; Number of Pins: 16; Contact Plating: Tin,Matte; Min Operating Temperature: 0°C; Max Operating Temperature: 70°C; Packaging: Cut Tape; Package Quantity: 2000; Number of Transmitters: 1; Number of Drivers: 1; Number of Transceivers: 1; Interface: RS-232; Radiation Hardening: No; REACH SVHC: Unknown; Lead Free: Lead Free; ComponentLink1URL: https://media.digikey.com/pdf/Data%20Sheets/Maxim%20PDFs/PartNumberBreakdown_ds.pdf?src-supplier=Digi-Key; ComponentLink1Description: https://media.digikey.com/pdf/Data%20Sheets/Maxim%20PDFs/PartNumberBreakdown_ds.pdf?src-supplier=Digi-Key; ComponentLink2URL: http://datasheets.maxim-ic.com/en/ds/MAX3221E-MAX3243E.pdf?src-supplier=Avnet+Europe; ComponentLink2Description: http://datasheets.maxim-ic.com/en/ds/MAX3221E-MAX3243E.pdf?src-supplier=Avnet+Europe; ComponentLink3URL: http://avnetexpress.avnet.com/store/em/EMController/Bus-Line-Transceiver/Maxim-Integrated/MAX3221ECAE-T/_/R-2407737/A-2407737/Check?src-supplier=Avnet; ComponentLink3Description: http://avnetexpress.avnet.com/store/em/EMController/Bus-Line-Transceiver/Maxim-Integrated/MAX3221ECAE-T/_/R-2407737/A-2407737/Check?src-supplier=Avnet; ComponentLink4URL: http://datasheets.maxim-ic.com/en/ds/MAX3221E-MAX3243E.pdf?src-supplier=Avnet; ComponentLink4Description: http://datasheets.maxim-ic.com/en/ds/MAX3221E-MAX3243E.pdf?src-supplier=Avnet; Supplier Part Number 1: MAX3221ECAE+TCT-ND
footprint 16-ssop
pins: 1 EN, 2 C1+, 3 V+, 4 C1-, 5 C2+, 6 C2-, 7 V-, 8 RIN (in), 9 ROUT (out), 10 INVALID (out), 11 TIN (in), 12 FORCEON, 13 TOUT (out), 14 GND, 15 VCC (power), 16 FORCEOFF

## MAX15027ATB+T
designator U?  Manufacturer Part Number: MAX15027ATB+T
IC REG LINEAR POS ADJ 1A 10TDFN; Manufacturer: Maxim; Max Input Voltage: 3.6V; Min Input Voltage: 1.425V; Output Voltage: 3.3V; Number of Outputs: 1; Max Power Dissipation: 1.951W; Dropout Voltage: 75mV; Min Current Limit: 1.4A; Polarity: Positive; Quiescent Current: 470uA; Min Output Voltage: 500mV; Output Type: Adjustable; Supplier 1: Digi-Key; Stock 1: 198; Pricing 1: 1=2.87, 10=2.579, 25=2.4332, 100=2.0732, 250=1.9467, 500=1.7034, 1000=1.4114 (USD); Mount: Surface Mount; Number of Pins: 10; Contact Plating: Tin,Matte; Min Operating Temperature: -40°C; Max Operating Temperature: 125°C; Output Current: 1A; Packaging: Tape and Reel; Max Output Current: 1A; Package Quantity: 1; Number of Regulators: 1; Max Output Voltage: 3.3V; Case/Package: 10-WFDFN; Radiation Hardening: No; REACH SVHC: Unknown; ComponentLink1URL: http://www.mouser.com/ds/2/256/MAX15027-MAX15028-101007.pdf?src-supplier=Mouser; ComponentLink1Description: http://www.mouser.com/ds/2/256/MAX15027-MAX15028-101007.pdf?src-supplier=Mouser; ComponentLink2URL: http://datasheets.maximintegrated.com/en/ds/MAX15027-MAX15028.pdf?src-supplier=Digi-Key; ComponentLink2Description: http://datasheets.maximintegrated.com/en/ds/MAX15027-MAX15028.pdf?src-supplier=Digi-Key; ComponentLink3URL: http://datasheets.maximintegrated.com/en/ds/MAX15027-MAX15028.pdf?src-supplier=Avnet; ComponentLink3Description: http://datasheets.maximintegrated.com/en/ds/MAX15027-MAX15028.pdf?src-supplier=Avnet; ComponentLink4URL: https://datasheets.maximintegrated.com/en/ds/MAX15027-MAX15028.pdf?src-supplier=Digi-Key; ComponentLink4Description: https://datasheets.maximintegrated.com/en/ds/MAX15027-MAX15028.pdf?src-supplier=Digi-Key; Supplier Part Number 1: MAX15027ATB+TCT-ND
footprint 10TDFN
pins: 1 IN (in), 2 IN (in), 3 IN (in), 4 IC, 5 EN (in), 6 SS (in), 7 FB (in), 8 GND (power), 9 OUT (out), 10 OUT (out), 11

## MB6S
designator U?
Bridge Rectifier MBS; Manufacturer Part Number: MB6S; Case/Package: SOIC-4
footprint SOP250P700X270-4N
pins: 1 +, 2 -, 3 AC1, 4 AC2

## MC60
designator U?  (value not drawn)
Quectel MC60 GSM/GPRS/GNSS Module, Bluetooth BT3.0; Manufacturer Part Number: MC60; Case/Package: SMD
pins: 1 MICP, 2 MICN, 3 SPKP, 4 SPKN, 5 PWRKEY, 6 ADC, 7 SD_CMD, 8 SD_CLK, 9 SD_DATA, 10 SIM2_CLK, 11 SIM2_DATA, 12 SIM2_RST, 13 SIM2_VDD, 14 GND, 15 GNSS_ANT, 16 SIM_GND, 17 RESERVED, 18 SIM1_VDD, 19 SIM1_CLK, 20 SIM1_RST, 21 SIM1_DATA, 22 GNSS_TXD, 23 GNSS_RXD, 24 RXD_AUX, 25 TXD_AUX, 26 GNSS_VCC, 27 GND, 28 GNSS_VCC_EN, 29 DBG_TXD, 30 DBG_RXD, 31 GND, 32 BT_ANT, 33 TXD, 34 RXD, 35 RI, 36 DCD, 37 DTR, 38 CTS, 39 RTS, 40 GND, 41 RF_ANT, 42 GND, 43 VDD_EXT, 44 GND, 45 GND, 46 RESERVED, 47 NETLIGHT, 48 GND, 49 GND, 50 VBAT, 51 VBAT, 52 VRTC, 53 LOUDSPKN, 54 LOUDSPKP
text: Quectel

## MCP39F501
designator U?
Power Management Specialised - PMIC Single-Phase Power-Monitoring IC; Manufacturer Part Number: MCP39F501; Case/Package: QFN-28
footprint MCP39F501 (Power Management Specialised - PMIC Single-Phase Power-Monitoring IC)
pins: 1 MODE/DIR (io), 4 UART_RX (io), 5 TEST_A (out), 6 OSCI (in), 7 OSCO (out), 10 RESET (in), 11 AVDD (power), 12 UART_TX (io), 13 TEST_B (in), 14 A0/DIO0 (io), 15 A1/DIO1 (io), 16 CH0+ (power), 17 CH0-, 18 CH1-, 19 CH1+, 20 AN_IN/DIO2, 21 AGND (power), 22 DIO3 (io), 23 REFIN+/OUT (out), 24 DGND (power), 25 DVDD, 26 MCLR (in), 27 DGND (power), 29 EP (power)

## MCP39F501-E/MQ
designator U?
Microchip MCP39F501-E/MQ Energy Measurement IC; Manufacturer Part Number: MCP39F501-E/MQ; Case/Package: QFN28 5X5MM
footprint QFN50P500X500X100-29N-D
footprint QFN28-5X5MM
pins: 1 MODE/DIR, 2 NC_1, 3 NC_2, 4 UART_RX, 5 COMMONA, 6 OSCI, 7 OSCO, 8 NC_3, 9 NC_4, 10 ~{RESET}, 11 AVDD, 12 UART_TX, 13 COMMONB, 14 A0/DIO0, 15 A1/DIO1, 16 I1+, 17 I1-, 18 V1-, 19 V1+, 20 AN_IN/DIO2, 21 AGND, 22 DIO3, 23 REFIN+/OUT, 24 DGND_1, 25 DVDD, 26 ~{MCLR}, 27 DGND_2, 28 ~{DR}, 29 EP

## MHCHL252012A-2R2M-Q8
designator L?
2.3A 2.2uH ±20% 87mΩ 2.5A SMD Power Inductors; Manufacturer Part Number: MHCHL252012A-2R2M-Q8; Case/Package: SMD; Value: 2.2uH
footprint MHCHL252012A-2R2M-Q8
pins: 2, 2

## MIC
designator U?
pins: 1 Input_Signal, 2 Input_Gnd

## MIC920YC5 AMPLIFIER
designator U?
pins: 1 IN+, 2 V-, 3 IN-, 4 OUT, 5 V+

## MIC5219-3.3YM5_TR
designator U?
LDO Regulator Pos 3.3V 0.5A MIC5219-3.3YM5 TR, Low Dropout Voltage Regulator, 0.5A, 3.3 V ??1%, 2.5 ??? 12 Vin, 5-Pin SOT-23; Manufacturer_Name: Micrel; Allied_Number: R1033592; Geometry.Height: 1.45mm; Manufacturer_Part_Number: MIC5219-3.3YM5 TR; Mouser Part Number: *; Mouser Price/Stock: *; RS Part Number: 7272524P; RS Price/Stock: http://uk.rs-online.com/web/p/products/7272524P; Allied Price/Stock: http://www.alliedelec.com/micrel-inc-mic5219-3-3ym5-tr/R1033592/; Datasheet Link: http://docs-emea.rs-online.com/webdocs/1385/0900766b8138542f.pdf
footprint SOT95P280X145-5N_MIC5219-3.3YM5
pins: 1 IN, 2 GND, 3 EN, 4 BYP, 5 OUT

## MIC5504-3.3YM5_TR
designator U?  (value not drawn)
Linear Voltage Regulator IC 1 Output 300mA SOT-23-5; Manufacturer Part Number: MIC5504-3.3YM5-TR; Value: *; Case/Package: SOT-23-5
footprint SOT95P280X145-5N
footprint SOT23-5
pins: 1 VIN, 2 GND (power), 3 EN, 5 VOUT

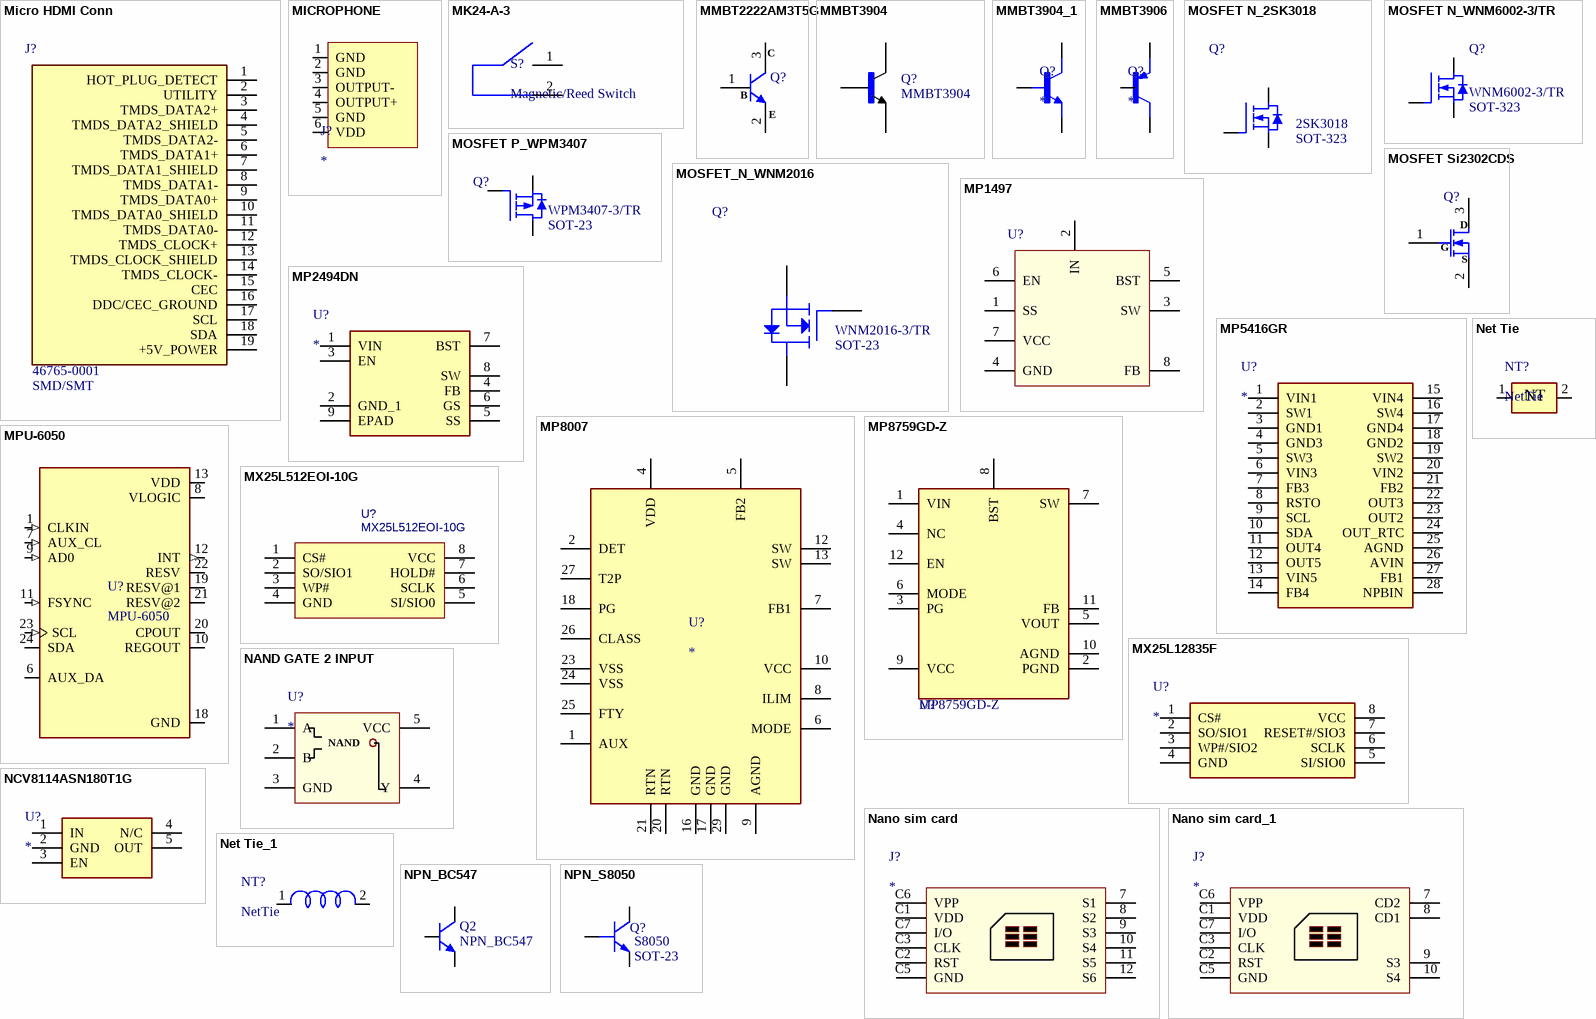
[diagram p19: symbols Micro HDMI Conn to NPN_S8050]

## Micro HDMI Conn
designator J?  Manufacturer Part Number: 46765-0001  Case/Package: SMD/SMT